# Altium footprint library SparkFun-Connectors.PCBLIB: 409 footprints (part 16 of 26)
Each footprint in its own frame and in the unit in brackets; x right, y up, seen from the top. Pads: shape width x height; smd on the part's side, far side on the other; paste and mask are expansions set on the pad; w line width, h text height; cw(c..) or ccw(c..) is an arc to the next point about the centre after c.
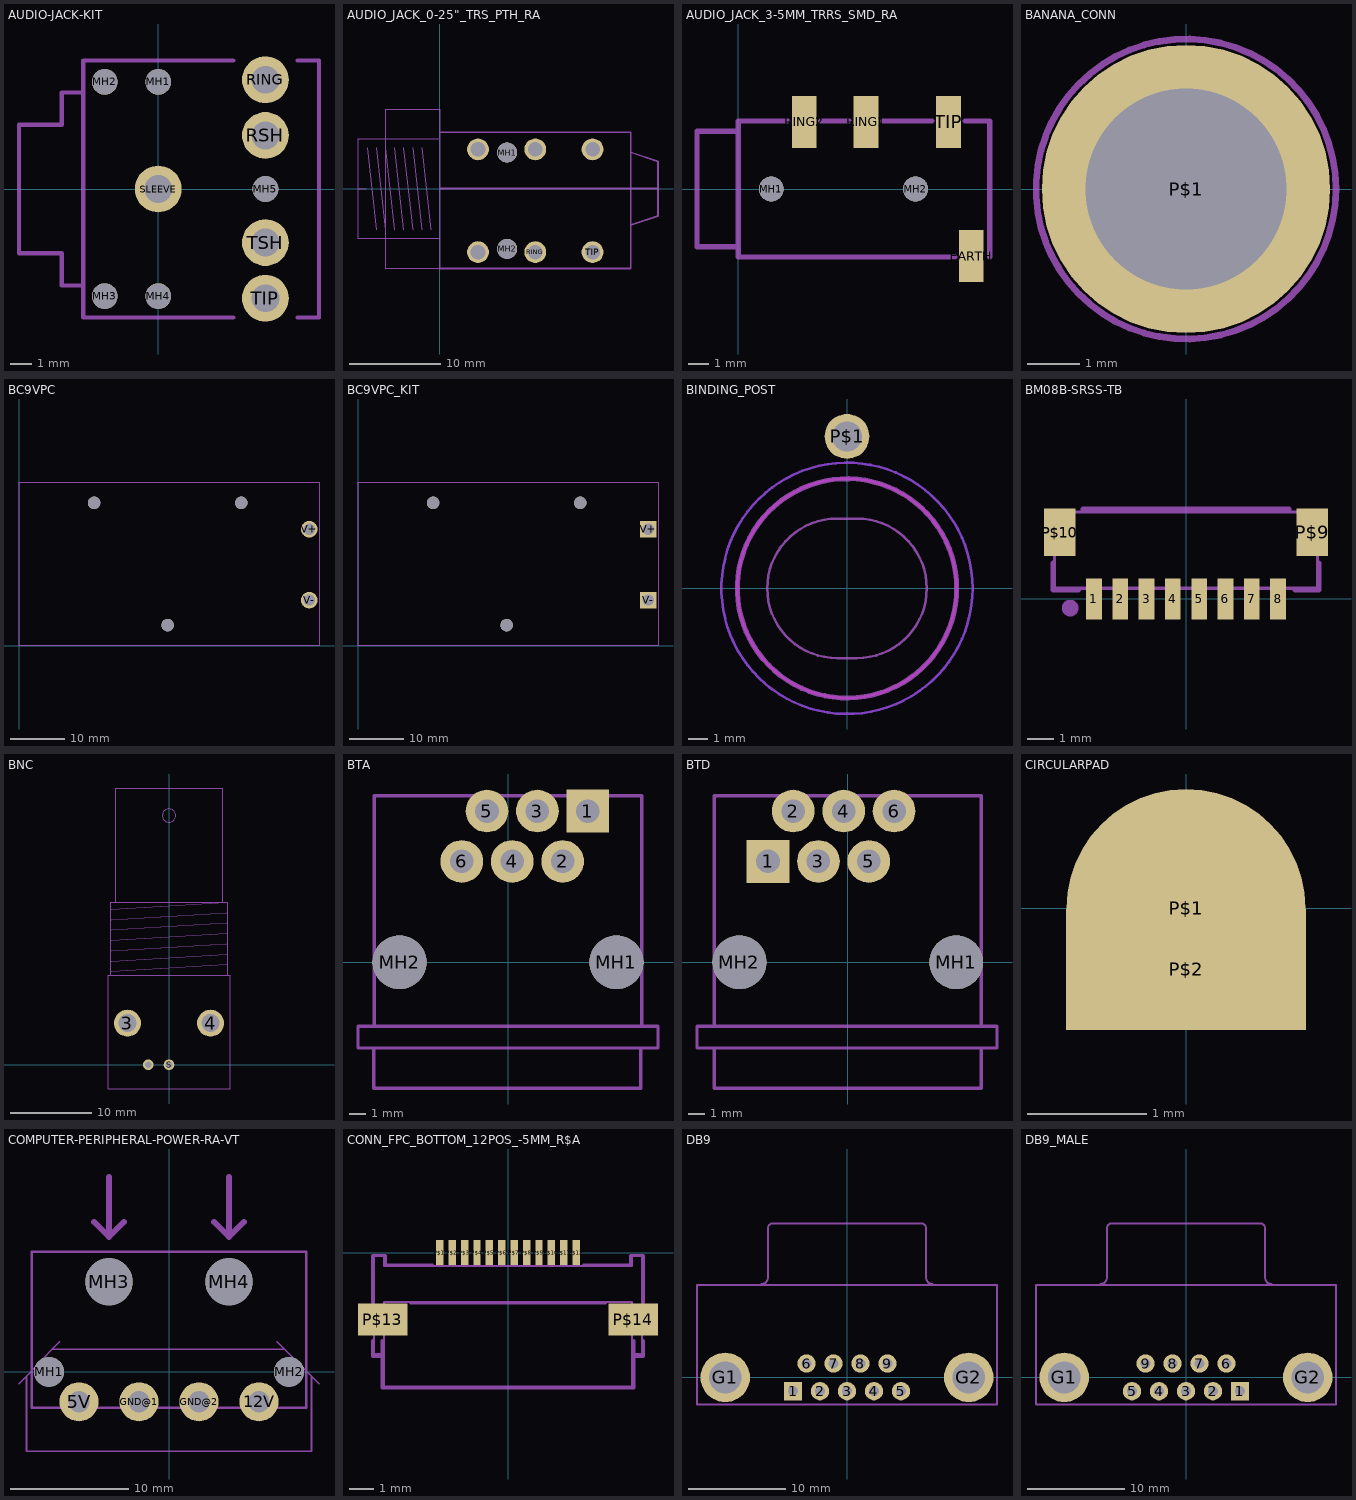
[diagram p15: the footprints below, top view; thin cyan lines are the x and y axes]

## AUDIO-JACK-KIT [mil]
pads (10):
  round 47.24 hole 47.24 unplated: MH1(0,196.85) MH2(-98.43,196.85) MH3(-98.43,-196.85) MH4(0,-196.85) MH5(196.85,0)
  round 86 hole 51.18: RING(196.85,200.79) RSH(196.85,98.43) SLEEVE(0,0) TIP(196.85,-200.79) TSH(196.85,-98.43)
Top Solder:
  circle w0: c0,0 r26
  circle w0: c196.85,200.79 r26
  circle w0: c196.85,98.43 r26
  circle w0: c196.85,-98.43 r26
  circle w0: c196.85,-200.79 r26
Bottom Solder:
  circle w0: c0,0 r48
  circle w0: c196.85,200.79 r48
  circle w0: c196.85,-200.79 r48
  circle w0: c196.85,-98.43 r48
  circle w0: c196.85,98.43 r48
tDocu:
  lines w8: -137.8,-236.22 -137.8,-177.17 -177.17,-177.17 -177.17,-118.11 -255.91,-118.11 -255.91,118.11 -177.17,118.11 -177.17,177.17 -137.8,177.17 -137.8,236.22
tPlace:
  lines w8: 137.8,-236.22 -137.8,-236.22 -137.8,236.22 137.8,236.22 ; 255.91,-236.22 295.28,-236.22 295.28,236.22 255.91,236.22

## AUDIO_JACK_0-25"_TRS_PTH_RA [mm]
pads (8):
  round 2.2 hole 2.2 unplated: MH1(7.4,4) MH2(7.4,-6.6)
  round 2.4 hole 1.6: RING(10.5,-6.95) RING-NORM(10.5,4.35) SLEEVE(4.2,-6.95) SLEEVE-NORM(4.2,4.35) TIP(16.8,-6.95) TIP-NORM(16.8,4.35)
tDocu:
  lines w0.127: -8.1,0.03 -9,0.03 ; -8,4.53 -7,-4.47 ; -7,4.53 -6,-4.47 ; -6,4.53 -5,-4.47 ; -5,4.53 -4,-4.47 ; -4,4.53 -3,-4.47 ; -3,4.53 -2,-4.47 ; -2,4.53 -1,-4.47 ; -9,0.03 -9,-5.47 0,-5.47 0,5.53 -9,5.53 -9,0.03 ; -6,-8.75 0,-8.75 0,8.75 -6,8.75 -6,-8.75
tPlace:
  lines w0.127: 0,-8.77 0,6.23
  lines w0.203: 0,-8.77 21,-8.77 21,-3.97 ; 0,6.23 21,6.23 21,4.03 ; 0.095,0.03 24,0.03 ; 21,-3.97 21,4.03 ; 21,-3.97 24,-2.97 24,0.03 ; 21,4.03 24,3.03 24,0.03

## AUDIO_JACK_3-5MM_TRRS_SMD_RA [mil]
pads (6):
  rect 47.24x98.43 smd: EARTH(444.88,-127.95) RING1(244.09,127.95) RING2(125.98,127.95) TIP(401.57,127.95)
  round 47.24 hole 47.24 unplated: MH1(62.99,0) MH2(338.58,0)
tDocu:
  lines w10: 19.69,-129.92 0,-129.92 0,-110.24 ; 19.69,129.92 0,129.92 0,110.24 ; 0,-110.24 0,110.24 ; 0,-110.24 -78.74,-110.24 -78.74,110.24 0,110.24
tPlace:
  lines w10: 19.69,-129.92 413.39,-129.92 ; 19.69,129.92 94.49,129.92 ; 157.48,129.92 212.6,129.92 ; 275.59,129.92 370.08,129.92 ; 433.07,129.92 480.32,129.92 480.32,-129.92

## BANANA_CONN [mil]
pads (1):
  round 215 hole 150: P$1(0,0)
tPlace:
  circle w5: c0,0 r111.8

## BC9VPC [mil]
pads (5):
  round 90 hole 90 unplated: MH1(1070,150) MH2(540,1030) MH3(1600,1030)
  round 120 hole 80: V+(2090,840) V-(2090,330)
tPlace:
  lines w5: 0,0 0,1180 2160,1180 2160,0 0,0
  text "V+" at 1940,820 h42.5
  text "V-" at 1940,310 h42.5

## BC9VPC_KIT [mil]
pads (5):
  round 90 hole 90 unplated: MH1(1070,150) MH2(540,1030) MH3(1600,1030)
  rect 120x120 / inner round 110.87 / far side rect 120x120 hole 80: V+(2090,840) V-(2090,330)
Bottom Solder:
  region: 2030,780 2030,900 2150,900 2150,780
  region: 2030,270 2030,390 2150,390 2150,270
tPlace:
  lines w5: 0,0 0,1180 2160,1180 2160,0 0,0
  text "V+" at 1940,820 h42.5
  text "V-" at 1940,310 h42.5

## BINDING_POST [mil]
pads (1):
  round 88.59 hole 59.06: P$1(0,300)
Top keep-out:
  circle w5: c0,0 r216.54
Bottom keep-out:
  circle w5: c0,0 r248.06
Dimension:
  lines w5: -157.48,0 cw(c-19.68,0.01) -19.69,137.8 ; -157.48,0 ccw(c-19.68,-0.01) -19.69,-137.8 ; -157.48,0 cw(c-19.68,0.01) -19.69,137.8 ; -157.48,0 ccw(c-19.68,-0.01) -19.69,-137.8 ; -19.69,-137.8 19.69,-137.8 ; -19.69,-137.8 19.69,-137.8 ; -19.69,137.8 19.69,137.8 ; -19.69,137.8 19.69,137.8 ; 19.69,-137.8 ccw(c19.68,-0.01) 157.48,0 ; 19.69,-137.8 ccw(c19.68,-0.01) 157.48,0 ; 19.69,137.8 cw(c19.68,0.01) 157.48,0 ; 19.69,137.8 cw(c19.68,0.01) 157.48,0
  text "ROUTE" at -100,0 h77.5
  text "OUT" at -100,-75 h77.5
tPlace:
  circle w10: c0,0 r216.54

## BM08B-SRSS-TB [mm]
pads (10):
  rect 0.6x1.55 smd: 1(-3.5,0) 2(-2.5,0) 3(-1.5,0) 4(-0.5,0) 5(0.5,0) 6(1.5,0) 7(2.5,0) 8(3.5,0)
  rect 1.2x1.8 smd: P$9(4.8,2.525) P$10(-4.8,2.525)
tDocu:
  lines w0.127: -5,0.4 -5,3.3 5,3.3 5,0.4 -5,0.4
tPlace:
  circle w0.406: c-4.4,-0.35 r0.112
  lines w0.203: -5.05,1.35 -5.05,0.35 -4.1,0.35 ; -3.9,3.4 3.9,3.4 ; 4.15,0.35 5.05,0.35 5.05,1.35

## BNC [mil]
pads (4):
  round 129.91 hole 86.61: 3(-200,200) 4(200,200)
  round 51.5 hole 31.5: GND(-100,0) S(0,0)
tDocu:
  circle w5: c0,1200 r32.2
  lines w5: -280,428 -280,783 -260,783 ; -279,449 279,483 ; -279,499 279,533 ; -279,549 279,583 ; -279,599 279,633 ; -279,649 279,683 ; -279,699 279,733 ; -279,749 279,783 ; 280,428 280,783 279,783 ; -260,783 260,783 ; -260,783 -260,1328 260,1328 260,783 ; 260,783 279,783
tPlace:
  lines w5: -295,-117 295,-117 295,428 -295,428 -295,-117

## BTA [mm]
pads (8):
  rect 2.54x2.54 / inner round 2.347 / far side rect 2.54x2.54 hole 1.4: 1(4.75,9)
  round 2.54 hole 1.4: 2(3.25,6) 3(1.75,9) 4(0.25,6) 5(-1.25,9) 6(-2.75,6)
  round 3.2 hole 3.2 unplated: MH1(6.45,0) MH2(-6.45,0)
tPlace:
  lines w0.203: -8,-5.1 -8,-7.5 7.9,-7.5 7.9,-5.1 ; -8,-5.1 -8.925,-5.1 -8.925,-3.8 -7.95,-3.8 ; -8,-5.1 7.9,-5.1 ; -7.95,-3.8 -7.95,9.9 7.95,9.9 7.95,-3.8 ; -7.95,-3.8 7.95,-3.8 ; 7.9,-5.1 8.925,-5.1 8.925,-3.8 7.95,-3.8

## BTD [mm]
pads (8):
  rect 2.54x2.54 / inner round 2.347 / far side rect 2.54x2.54 hole 1.4: 1(-4.75,6)
  round 2.54 hole 1.4: 2(-3.25,9) 3(-1.75,6) 4(-0.25,9) 5(1.25,6) 6(2.75,9)
  round 3.2 hole 3.2 unplated: MH1(6.45,0) MH2(-6.45,0)
tPlace:
  lines w0.203: -7.95,-5.1 -8.975,-5.1 -8.975,-3.8 -7.95,-3.8 ; -7.95,-5.1 7.95,-5.1 ; -7.95,-5.1 -7.95,-7.5 7.95,-7.5 7.95,-5.1 ; -7.95,-3.8 -7.95,9.9 7.95,9.9 7.95,-3.8 ; -7.95,-3.8 7.95,-3.8 ; 7.95,-5.1 8.875,-5.1 8.875,-3.8 7.95,-3.8

## CIRCULARPAD [mil]
pads (2):
  rrect100% 78.74x78.74 smd: P$1(0,0)
  rect 79x40 smd: P$2(0,-20)

## COMPUTER-PERIPHERAL-POWER-RA-VT [mil]
pads (8):
  round 130 hole 71.65: 5V(-300,-100) 12V(300,-100) GND@1(-100,-100) GND@2(100,-100)
  round 100 hole 100 unplated: MH1(-400,0) MH2(400,0)
  round 157 hole 157 unplated: MH3(-200,300) MH4(200,300)
tDocu:
  lines w8: -458,-120 458,-120
  lines w20: -250,500 -200,450 ; -200,650 -200,450 ; -150,500 -200,450 ; 150,500 200,450 ; 200,650 200,450 ; 250,500 200,450
  text "INSERT" at -120,525 h77.5
tPlace:
  lines w6: -500,-40 -475,-15 ; -365,100 -390,75 ; 360,100 385,75 ; 500,-40 475,-15 ; -475,-15 -475,-265 475,-265 475,-15 ; -475,-15 -390,75 ; -390,75 385,75 ; 385,75 475,-15
  lines w8: -350,-120 -458,-120 -458,400 458,400 458,-120 350,-120 ; -250,-120 -150,-120 ; -50,-120 50,-120 ; 150,-120 250,-120

## CONN_FPC_BOTTOM_12POS_-5MM_R$A [mm]
pads (14):
  rect 0.3x1 smd: P$1(-2.75,0) P$2(-2.25,0) P$3(-1.75,0) P$4(-1.25,0) P$5(-0.75,0) P$6(-0.25,0) P$7(0.25,0) P$8(0.75,0) P$9(1.25,0) P$10(1.75,0) P$11(2.25,0) P$12(2.75,0)
  rect 2x1.3 smd: P$13(-5.05,-2.7) P$14(5.05,-2.7)
tDocu:
  lines w0.076: -5,-4.1 -5.4,-4.1 -5.4,-0.15 -5,-0.15 -5,-0.55 5,-0.55 5,-0.15 5.4,-0.15 5.4,-4.1 5,-4.1 ; -5,-4.1 -5,-5.4 5,-5.4 5,-4.1 ; -5,-4.1 -5,-2 5,-2 5,-4.1
  text "MOLEX 5051101292" at -2,-5 h0.39
tPlace:
  lines w0.127: -5.461,-3.556 -5.461,-4.191 -5.08,-4.191 ; -5.461,-2.032 -5.461,-0.127 -4.953,-0.127 -4.953,-0.508 -3.048,-0.508 ; -5.08,-3.556 -5.08,-4.191 ; -3.937,-2.032 3.937,-2.032 ; 3.048,-0.508 4.953,-0.508 4.953,-0.127 5.461,-0.127 5.461,-2.032 ; 5.08,-4.191 5.461,-4.191 5.461,-3.556 ; 5.08,-3.556 5.08,-5.461 -5.08,-5.461 -5.08,-4.191

## DB9 [mil]
pads (11):
  rect 74x74 / inner round 68.37 / far side rect 74x74 hole 40: 1(-218.11,-55.91)
  round 74 hole 40: 2(-109.06,-55.91) 3(0,-55.91) 4(109.06,-55.91) 5(218.11,-55.91) 6(-163.39,55.91) 7(-54.33,55.91) 8(54.33,55.91) 9(163.39,55.91)
  round 200 hole 130: G1(-492.13,0) G2(492.13,0)
tDocu:
  lines w8: -606.3,100 -606.3,-110.24 606.3,-110.24 606.3,100 606.3,374.02 -606.3,374.02 -606.3,100.1 ; -345,377.32 ccw(c-345,402.32) -320,402.32 -320,602.32 cw(c-300,602.32) -300,622.32 300,622.32 cw(c300,602.32) 320,602.32 320,402.32 ccw(c345,402.32) 345,377.32

## DB9_MALE [mil]
pads (11):
  rect 74x74 / inner round 68.37 / far side rect 74x74 hole 40: 1(218.11,-55.91)
  round 74 hole 40: 2(109.06,-55.91) 3(0,-55.91) 4(-109.06,-55.91) 5(-218.11,-55.91) 6(163.39,55.91) 7(54.33,55.91) 8(-54.33,55.91) 9(-163.39,55.91)
  round 200 hole 130: G1(-492.13,0) G2(492.13,0)
tDocu:
  lines w8: -606.3,100.1 -606.3,374.02 606.3,374.02 606.3,100 ; -345,377.32 ccw(c-345,402.32) -320,402.32 -320,602.32 cw(c-300,602.32) -300,622.32 300,622.32 cw(c300,602.32) 320,602.32 320,402.32 ccw(c345,402.32) 345,377.32
tPlace:
  lines w8: -606.3,100 -606.3,-110.24 606.3,-110.24 606.3,100